# Altium integrated library WE_WR-TBL_Pluggable System_3.81 mm_rev15b.IntLib: 215 symbols (part 1 of 2)
Pins are listed as number, name and electrical type; pins without a type are passive.

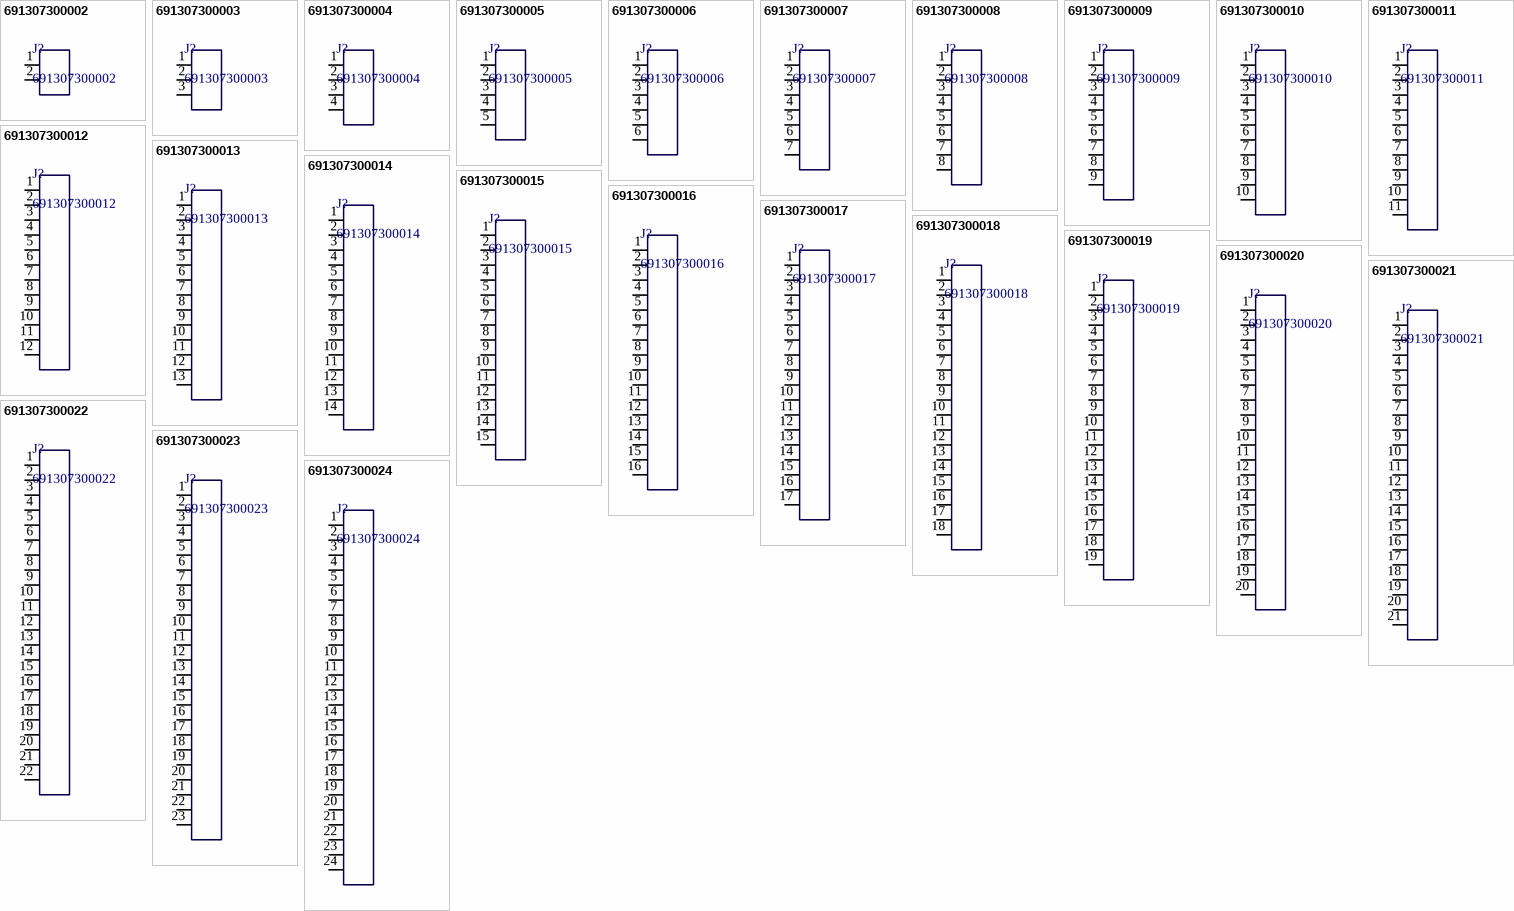
[diagram p0: symbols 691307300002 to 691307300024]

## 691307300002
designator J?
WR-TBL Terminal Blocks - Serie 3073; Manufacturer: Wurth Elektronik; ComponentLink1 Description: Manufacturer; ComponentLink2 Description: Datasheet; ComponentLink1URL: http://www.we-online.de; ComponentLink2URL: http://katalog.we-online.de/em/datasheet/6913073000xx.pdf; Created by: Baojun Chen; Created Date: 7.Sep.2015; partNo: 691307300002
footprint 691307300002 (Serie 3073 - 3.81 mm _ 2 pins)
pins: 1, 2

## 691307300003
designator J?
WR-TBL Terminal Blocks - Serie 3073; Manufacturer: Wurth Elektronik; ComponentLink1 Description: Manufacturer; ComponentLink2 Description: Datasheet; ComponentLink1URL: http://www.we-online.de; ComponentLink2URL: http://katalog.we-online.de/em/datasheet/6913073000xx.pdf; Created by: Baojun Chen; Created Date: 7.Sep.2015; partNo: 691307300003
footprint 691307300003 (Serie 3073 - 3.81 mm _ 3 pins)
pins: 1, 2, 3

## 691307300004
designator J?
WR-TBL Terminal Blocks - Serie 3073; Manufacturer: Wurth Elektronik; ComponentLink1 Description: Manufacturer; ComponentLink2 Description: Datasheet; ComponentLink1URL: http://www.we-online.de; ComponentLink2URL: http://katalog.we-online.de/em/datasheet/6913073000xx.pdf; Created by: Baojun Chen; Created Date: 7.Sep.2015; partNo: 691307300004
footprint 691307300004 (Serie 3073 - 3.81 mm _ 4 pins)
pins: 1, 2, 3, 4

## 691307300005
designator J?
WR-TBL Terminal Blocks - Serie 3073; Manufacturer: Wurth Elektronik; ComponentLink1 Description: Manufacturer; ComponentLink2 Description: Datasheet; ComponentLink1URL: http://www.we-online.de; ComponentLink2URL: http://katalog.we-online.de/em/datasheet/6913073000xx.pdf; Created by: Baojun Chen; Created Date: 7.Sep.2015; partNo: 691307300005
footprint 691307300005 (Serie 3073 - 3.81 mm _ 5 pins)
pins: 1, 2, 3, 4, 5

## 691307300006
designator J?
WR-TBL Terminal Blocks - Serie 3073; Manufacturer: Wurth Elektronik; ComponentLink1 Description: Manufacturer; ComponentLink2 Description: Datasheet; ComponentLink1URL: http://www.we-online.de; ComponentLink2URL: http://katalog.we-online.de/em/datasheet/6913073000xx.pdf; Created by: Baojun Chen; Created Date: 7.Sep.2015; partNo: 691307300006
footprint 691307300006 (Serie 3073 - 3.81 mm _ 6 pins)
pins: 1, 2, 3, 4, 5, 6

## 691307300007
designator J?
WR-TBL Terminal Blocks - Serie 3073; Manufacturer: Wurth Elektronik; ComponentLink1 Description: Manufacturer; ComponentLink2 Description: Datasheet; ComponentLink1URL: http://www.we-online.de; ComponentLink2URL: http://katalog.we-online.de/em/datasheet/6913073000xx.pdf; Created by: Baojun Chen; Created Date: 7.Sep.2015; partNo: 691307300007
footprint 691307300007 (Serie 3073 - 3.81 mm _ 7 pins)
pins: 1, 2, 3, 4, 5, 6, 7

## 691307300008
designator J?
WR-TBL Terminal Blocks - Serie 3073; Manufacturer: Wurth Elektronik; ComponentLink1 Description: Manufacturer; ComponentLink2 Description: Datasheet; ComponentLink1URL: http://www.we-online.de; ComponentLink2URL: http://katalog.we-online.de/em/datasheet/6913073000xx.pdf; Created by: Baojun Chen; Created Date: 7.Sep.2015; partNo: 691307300008
footprint 691307300008 (Serie 3073 - 3.81 mm _ 8 pins)
pins: 1, 2, 3, 4, 5, 6, 7, 8

## 691307300009
designator J?
WR-TBL Terminal Blocks - Serie 3073; Manufacturer: Wurth Elektronik; ComponentLink1 Description: Manufacturer; ComponentLink2 Description: Datasheet; ComponentLink1URL: http://www.we-online.de; ComponentLink2URL: http://katalog.we-online.de/em/datasheet/6913073000xx.pdf; Created by: Baojun Chen; Created Date: 7.Sep.2015; partNo: 691307300009
footprint 691307300009 (Serie 3073 - 3.81 mm _ 9 pins)
pins: 1, 2, 3, 4, 5, 6, 7, 8, 9

## 691307300010
designator J?
WR-TBL Terminal Blocks - Serie 3073; Manufacturer: Wurth Elektronik; ComponentLink1 Description: Manufacturer; ComponentLink2 Description: Datasheet; ComponentLink1URL: http://www.we-online.de; ComponentLink2URL: http://katalog.we-online.de/em/datasheet/6913073000xx.pdf; Created by: Baojun Chen; Created Date: 7.Sep.2015; partNo: 691307300010
footprint 691307300010 (Serie 3073 - 3.81 mm _ 10 pins)
pins: 1, 2, 3, 4, 5, 6, 7, 8, 9, 10

## 691307300011
designator J?
WR-TBL Terminal Blocks - Serie 3073; Manufacturer: Wurth Elektronik; ComponentLink1 Description: Manufacturer; ComponentLink2 Description: Datasheet; ComponentLink1URL: http://www.we-online.de; ComponentLink2URL: http://katalog.we-online.de/em/datasheet/6913073000xx.pdf; Created by: Baojun Chen; Created Date: 7.Sep.2015; partNo: 691307300011
footprint 691307300011 (Serie 3073 - 3.81 mm _ 11 pins)
pins: 1, 2, 3, 4, 5, 6, 7, 8, 9, 10, 11

## 691307300012
designator J?
WR-TBL Terminal Blocks - Serie 3073; Manufacturer: Wurth Elektronik; ComponentLink1 Description: Manufacturer; ComponentLink2 Description: Datasheet; ComponentLink1URL: http://www.we-online.de; ComponentLink2URL: http://katalog.we-online.de/em/datasheet/6913073000xx.pdf; Created by: Baojun Chen; Created Date: 7.Sep.2015; partNo: 691307300012
footprint 691307300012 (Serie 3073 - 3.81 mm _ 12 pins)
pins: 1, 2, 3, 4, 5, 6, 7, 8, 9, 10, 11, 12

## 691307300013
designator J?
WR-TBL Terminal Blocks - Serie 3073; Manufacturer: Wurth Elektronik; ComponentLink1 Description: Manufacturer; ComponentLink2 Description: Datasheet; ComponentLink1URL: http://www.we-online.de; ComponentLink2URL: http://katalog.we-online.de/em/datasheet/6913073000xx.pdf; Created by: Baojun Chen; Created Date: 7.Sep.2015; partNo: 691307300013
footprint 691307300013 (Serie 3073 - 3.81 mm _ 13 pins)
pins: 1, 2, 3, 4, 5, 6, 7, 8, 9, 10, 11, 12, 13

## 691307300014
designator J?
WR-TBL Terminal Blocks - Serie 3073; Manufacturer: Wurth Elektronik; ComponentLink1 Description: Manufacturer; ComponentLink2 Description: Datasheet; ComponentLink1URL: http://www.we-online.de; ComponentLink2URL: http://katalog.we-online.de/em/datasheet/6913073000xx.pdf; Created by: Baojun Chen; Created Date: 7.Sep.2015; partNo: 691307300014
footprint 691307300014 (Serie 3073 - 3.81 mm _ 14 pins)
pins: 1, 2, 3, 4, 5, 6, 7, 8, 9, 10, 11, 12, 13, 14

## 691307300015
designator J?
WR-TBL Terminal Blocks - Serie 3073; Manufacturer: Wurth Elektronik; ComponentLink1 Description: Manufacturer; ComponentLink2 Description: Datasheet; ComponentLink1URL: http://www.we-online.de; ComponentLink2URL: http://katalog.we-online.de/em/datasheet/6913073000xx.pdf; Created by: Baojun Chen; Created Date: 7.Sep.2015; partNo: 691307300015
footprint 691307300015 (Serie 3073 - 3.81 mm _ 15 pins)
pins: 1, 2, 3, 4, 5, 6, 7, 8, 9, 10, 11, 12, 13, 14, 15

## 691307300016
designator J?
WR-TBL Terminal Blocks - Serie 3073; Manufacturer: Wurth Elektronik; ComponentLink1 Description: Manufacturer; ComponentLink2 Description: Datasheet; ComponentLink1URL: http://www.we-online.de; ComponentLink2URL: http://katalog.we-online.de/em/datasheet/6913073000xx.pdf; Created by: Baojun Chen; Created Date: 7.Sep.2015; partNo: 691307300016
footprint 691307300016 (Serie 3073 - 3.81 mm _ 16 pins)
pins: 1, 2, 3, 4, 5, 6, 7, 8, 9, 10, 11, 12, 13, 14, 15, 16

## 691307300017
designator J?
WR-TBL Terminal Blocks - Serie 3073; Manufacturer: Wurth Elektronik; ComponentLink1 Description: Manufacturer; ComponentLink2 Description: Datasheet; ComponentLink1URL: http://www.we-online.de; ComponentLink2URL: http://katalog.we-online.de/em/datasheet/6913073000xx.pdf; Created by: Baojun Chen; Created Date: 7.Sep.2015; partNo: 691307300017
footprint 691307300017 (Serie 3073 - 3.81 mm _ 17 pins)
pins: 1, 2, 3, 4, 5, 6, 7, 8, 9, 10, 11, 12, 13, 14, 15, 16, 17

## 691307300018
designator J?
WR-TBL Terminal Blocks - Serie 3073; Manufacturer: Wurth Elektronik; ComponentLink1 Description: Manufacturer; ComponentLink2 Description: Datasheet; ComponentLink1URL: http://www.we-online.de; ComponentLink2URL: http://katalog.we-online.de/em/datasheet/6913073000xx.pdf; Created by: Baojun Chen; Created Date: 7.Sep.2015; partNo: 691307300018
footprint 691307300018 (Serie 3073 - 3.81 mm _ 18 pins)
pins: 1, 2, 3, 4, 5, 6, 7, 8, 9, 10, 11, 12, 13, 14, 15, 16, 17, 18

## 691307300019
designator J?
WR-TBL Terminal Blocks - Serie 3073; Manufacturer: Wurth Elektronik; ComponentLink1 Description: Manufacturer; ComponentLink2 Description: Datasheet; ComponentLink1URL: http://www.we-online.de; ComponentLink2URL: http://katalog.we-online.de/em/datasheet/6913073000xx.pdf; Created by: Baojun Chen; Created Date: 7.Sep.2015; partNo: 691307300019
footprint 691307300019 (Serie 3073 - 3.81 mm _ 19 pins)
pins: 1, 2, 3, 4, 5, 6, 7, 8, 9, 10, 11, 12, 13, 14, 15, 16, 17, 18, 19

## 691307300020
designator J?
WR-TBL Terminal Blocks - Serie 3073; Manufacturer: Wurth Elektronik; ComponentLink1 Description: Manufacturer; ComponentLink2 Description: Datasheet; ComponentLink1URL: http://www.we-online.de; ComponentLink2URL: http://katalog.we-online.de/em/datasheet/6913073000xx.pdf; Created by: Baojun Chen; Created Date: 7.Sep.2015; partNo: 691307300020
footprint 691307300020 (Serie 3073 - 3.81 mm _ 20 pins)
pins: 1, 2, 3, 4, 5, 6, 7, 8, 9, 10, 11, 12, 13, 14, 15, 16, 17, 18, 19, 20

## 691307300021
designator J?
WR-TBL Terminal Blocks - Serie 3073; Manufacturer: Wurth Elektronik; ComponentLink1 Description: Manufacturer; ComponentLink2 Description: Datasheet; ComponentLink1URL: http://www.we-online.de; ComponentLink2URL: http://katalog.we-online.de/em/datasheet/6913073000xx.pdf; Created by: Baojun Chen; Created Date: 7.Sep.2015; partNo: 691307300021
footprint 691307300021 (Serie 3073 - 3.81 mm _ 21 pins)
pins: 1, 2, 3, 4, 5, 6, 7, 8, 9, 10, 11, 12, 13, 14, 15, 16, 17, 18, 19, 20, 21

## 691307300022
designator J?
WR-TBL Terminal Blocks - Serie 3073; Manufacturer: Wurth Elektronik; ComponentLink1 Description: Manufacturer; ComponentLink2 Description: Datasheet; ComponentLink1URL: http://www.we-online.de; ComponentLink2URL: http://katalog.we-online.de/em/datasheet/6913073000xx.pdf; Created by: Baojun Chen; Created Date: 7.Sep.2015; partNo: 691307300022
footprint 691307300022 (Serie 3073 - 3.81 mm _ 22 pins)
pins: 1, 2, 3, 4, 5, 6, 7, 8, 9, 10, 11, 12, 13, 14, 15, 16, 17, 18, 19, 20, 21, 22

## 691307300023
designator J?
WR-TBL Terminal Blocks - Serie 3073; Manufacturer: Wurth Elektronik; ComponentLink1 Description: Manufacturer; ComponentLink2 Description: Datasheet; ComponentLink1URL: http://www.we-online.de; ComponentLink2URL: http://katalog.we-online.de/em/datasheet/6913073000xx.pdf; Created by: Baojun Chen; Created Date: 7.Sep.2015; partNo: 691307300023
footprint 691307300023 (Serie 3073 - 3.81 mm _ 23 pins)
pins: 1, 2, 3, 4, 5, 6, 7, 8, 9, 10, 11, 12, 13, 14, 15, 16, 17, 18, 19, 20, 21, 22, 23

## 691307300024
designator J?
WR-TBL Terminal Blocks - Serie 3073; Manufacturer: Wurth Elektronik; ComponentLink1 Description: Manufacturer; ComponentLink2 Description: Datasheet; ComponentLink1URL: http://www.we-online.de; ComponentLink2URL: http://katalog.we-online.de/em/datasheet/6913073000xx.pdf; Created by: Baojun Chen; Created Date: 7.Sep.2015; partNo: 691307300024
footprint 691307300024 (Serie 3073 - 3.81 mm _ 24 pins)
pins: 1, 2, 3, 4, 5, 6, 7, 8, 9, 10, 11, 12, 13, 14, 15, 16, 17, 18, 19, 20, 21, 22, 23, 24


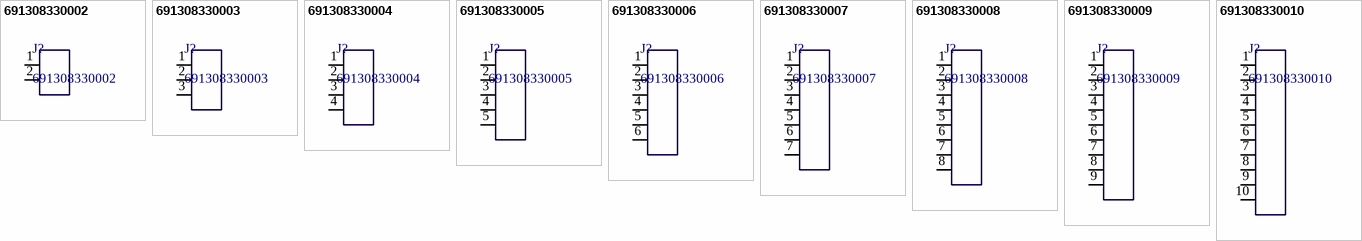
[diagram p1: symbols 691308330002 to 691308330010]

## 691308330002
designator J?
WR-TBL Terminal Blocks - Serie 3083; Manufacturer: Wurth Elektronik; ComponentLink1 Description: Manufacturer; ComponentLink2 Description: Datasheet; ComponentLink1URL: http://www.we-online.de; ComponentLink2URL: http://katalog.we-online.de/em/datasheet/6913083300xx.pdf; Created by: Baojun Chen; Created Date: 7.Sep.2015; partNo: 691308330002
footprint 691308330002 (Serie 3083 - 3.81 mm _ 2 pins)
pins: 1, 2

## 691308330003
designator J?
WR-TBL Terminal Blocks - Serie 3083; Manufacturer: Wurth Elektronik; ComponentLink1 Description: Manufacturer; ComponentLink2 Description: Datasheet; ComponentLink1URL: http://www.we-online.de; ComponentLink2URL: http://katalog.we-online.de/em/datasheet/6913083300xx.pdf; Created by: Baojun Chen; Created Date: 7.Sep.2015; partNo: 691308330003
footprint 691308330003 (Serie 3083 - 3.81 mm _ 3 pins)
pins: 1, 2, 3

## 691308330004
designator J?
WR-TBL Terminal Blocks - Serie 3083; Manufacturer: Wurth Elektronik; ComponentLink1 Description: Manufacturer; ComponentLink2 Description: Datasheet; ComponentLink1URL: http://www.we-online.de; ComponentLink2URL: http://katalog.we-online.de/em/datasheet/6913083300xx.pdf; Created by: Baojun Chen; Created Date: 7.Sep.2015; partNo: 691308330004
footprint 691308330004 (Serie 3083 - 3.81 mm _ 4 pins)
pins: 1, 2, 3, 4

## 691308330005
designator J?
WR-TBL Terminal Blocks - Serie 3083; Manufacturer: Wurth Elektronik; ComponentLink1 Description: Manufacturer; ComponentLink2 Description: Datasheet; ComponentLink1URL: http://www.we-online.de; ComponentLink2URL: http://katalog.we-online.de/em/datasheet/6913083300xx.pdf; Created by: Baojun Chen; Created Date: 7.Sep.2015; partNo: 691308330005
footprint 691308330005 (Serie 3083 - 3.81 mm _ 5 pins)
pins: 1, 2, 3, 4, 5

## 691308330006
designator J?
WR-TBL Terminal Blocks - Serie 3083; Manufacturer: Wurth Elektronik; ComponentLink1 Description: Manufacturer; ComponentLink2 Description: Datasheet; ComponentLink1URL: http://www.we-online.de; ComponentLink2URL: http://katalog.we-online.de/em/datasheet/6913083300xx.pdf; Created by: Baojun Chen; Created Date: 7.Sep.2015; partNo: 691308330006
footprint 691308330006 (Serie 3083 - 3.81 mm _ 6 pins)
pins: 1, 2, 3, 4, 5, 6

## 691308330007
designator J?
WR-TBL Terminal Blocks - Serie 3083; Manufacturer: Wurth Elektronik; ComponentLink1 Description: Manufacturer; ComponentLink2 Description: Datasheet; ComponentLink1URL: http://www.we-online.de; ComponentLink2URL: http://katalog.we-online.de/em/datasheet/6913083300xx.pdf; Created by: Baojun Chen; Created Date: 7.Sep.2015; partNo: 691308330007
footprint 691308330007 (Serie 3083 - 3.81 mm _ 7 pins)
pins: 1, 2, 3, 4, 5, 6, 7

## 691308330008
designator J?
WR-TBL Terminal Blocks - Serie 3083; Manufacturer: Wurth Elektronik; ComponentLink1 Description: Manufacturer; ComponentLink2 Description: Datasheet; ComponentLink1URL: http://www.we-online.de; ComponentLink2URL: http://katalog.we-online.de/em/datasheet/6913083300xx.pdf; Created by: Baojun Chen; Created Date: 7.Sep.2015; partNo: 691308330008
footprint 691308330008 (Serie 3083 - 3.81 mm _ 8 pins)
pins: 1, 2, 3, 4, 5, 6, 7, 8

## 691308330009
designator J?
WR-TBL Terminal Blocks - Serie 3083; Manufacturer: Wurth Elektronik; ComponentLink1 Description: Manufacturer; ComponentLink2 Description: Datasheet; ComponentLink1URL: http://www.we-online.de; ComponentLink2URL: http://katalog.we-online.de/em/datasheet/6913083300xx.pdf; Created by: Baojun Chen; Created Date: 7.Sep.2015; partNo: 691308330009
footprint 691308330009 (Serie 3083 - 3.81 mm _ 9 pins)
pins: 1, 2, 3, 4, 5, 6, 7, 8, 9

## 691308330010
designator J?
WR-TBL Terminal Blocks - Serie 3083; Manufacturer: Wurth Elektronik; ComponentLink1 Description: Manufacturer; ComponentLink2 Description: Datasheet; ComponentLink1URL: http://www.we-online.de; ComponentLink2URL: http://katalog.we-online.de/em/datasheet/6913083300xx.pdf; Created by: Baojun Chen; Created Date: 7.Sep.2015; partNo: 691308330010
footprint 691308330010 (Serie 3083 - 3.81 mm _ 10 pins)
pins: 1, 2, 3, 4, 5, 6, 7, 8, 9, 10


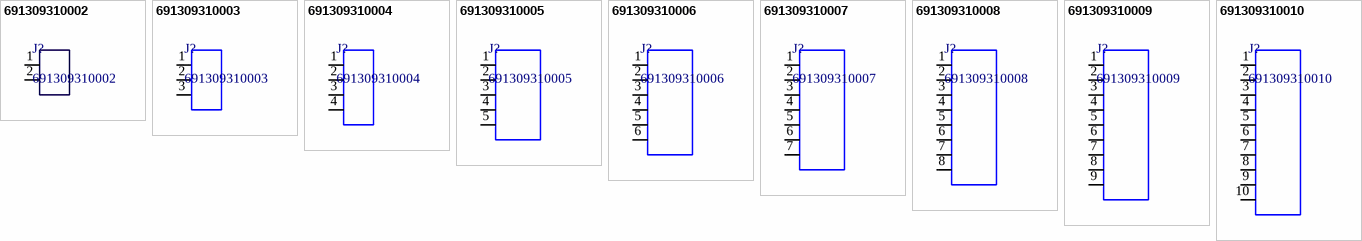
[diagram p2: symbols 691309310002 to 691309310010]

## 691309310002
designator J?
WR-TBL Terminal Blocks - Serie 3093; Manufacturer: Wurth Elektronik; ComponentLink1 Description: Manufacturer; ComponentLink2 Description: Datasheet; ComponentLink1URL: http://www.we-online.de; ComponentLink2URL: http://katalog.we-online.de/em/datasheet/6913093100xx.pdf; Created by: Baojun Chen; Created Date: 8.Sep.2015; partNo: 691309310002
footprint 691309310002 (Serie 3093 - 3.81 mm _ 2 pins)
pins: 1, 2

## 691309310003
designator J?
WR-TBL Terminal Blocks - Serie 3093; Manufacturer: Wurth Elektronik; ComponentLink1 Description: Manufacturer; ComponentLink2 Description: Datasheet; ComponentLink1URL: http://www.we-online.de; ComponentLink2URL: http://katalog.we-online.de/em/datasheet/6913093100xx.pdf; Created by: Baojun Chen; Created Date: 8.Sep.2015; partNo: 691309310003
footprint 691309310003 (Serie 3093 - 3.81 mm _ 3 pins)
pins: 1, 2, 3

## 691309310004
designator J?
WR-TBL Terminal Blocks - Serie 3093; Manufacturer: Wurth Elektronik; ComponentLink1 Description: Manufacturer; ComponentLink2 Description: Datasheet; ComponentLink1URL: http://www.we-online.de; ComponentLink2URL: http://katalog.we-online.de/em/datasheet/6913093100xx.pdf; Created by: Baojun Chen; Created Date: 8.Sep.2015; partNo: 691309310004
footprint 691309310004 (Serie 3093 - 3.81 mm _ 4 pins)
pins: 1, 2, 3, 4

## 691309310005
designator J?
WR-TBL Terminal Blocks - Serie 3093; Manufacturer: Wurth Elektronik; ComponentLink1 Description: Manufacturer; ComponentLink2 Description: Datasheet; ComponentLink1URL: http://www.we-online.de; ComponentLink2URL: http://katalog.we-online.de/em/datasheet/6913093100xx.pdf; Created by: Baojun Chen; Created Date: 8.Sep.2015; partNo: 691309310005
footprint 691309310005 (Serie 3093 - 3.81 mm _ 5 pins)
pins: 1, 2, 3, 4, 5

## 691309310006
designator J?
WR-TBL Terminal Blocks - Serie 3093; Manufacturer: Wurth Elektronik; ComponentLink1 Description: Manufacturer; ComponentLink2 Description: Datasheet; ComponentLink1URL: http://www.we-online.de; ComponentLink2URL: http://katalog.we-online.de/em/datasheet/6913093100xx.pdf; Created by: Baojun Chen; Created Date: 8.Sep.2015; partNo: 691309310006
footprint 691309310006 (Serie 3093 - 3.81 mm _ 6 pins)
pins: 1, 2, 3, 4, 5, 6

## 691309310007
designator J?
WR-TBL Terminal Blocks - Serie 3093; Manufacturer: Wurth Elektronik; ComponentLink1 Description: Manufacturer; ComponentLink2 Description: Datasheet; ComponentLink1URL: http://www.we-online.de; ComponentLink2URL: http://katalog.we-online.de/em/datasheet/6913093100xx.pdf; Created by: Baojun Chen; Created Date: 8.Sep.2015; partNo: 691309310007
footprint 691309310007 (Serie 3093 - 3.81 mm _ 7 pins)
pins: 1, 2, 3, 4, 5, 6, 7

## 691309310008
designator J?
WR-TBL Terminal Blocks - Serie 3093; Manufacturer: Wurth Elektronik; ComponentLink1 Description: Manufacturer; ComponentLink2 Description: Datasheet; ComponentLink1URL: http://www.we-online.de; ComponentLink2URL: http://katalog.we-online.de/em/datasheet/6913093100xx.pdf; Created by: Baojun Chen; Created Date: 8.Sep.2015; partNo: 691309310008
footprint 691309310008 (Serie 3093 - 3.81 mm _ 8 pins)
pins: 1, 2, 3, 4, 5, 6, 7, 8

## 691309310009
designator J?
WR-TBL Terminal Blocks - Serie 3093; Manufacturer: Wurth Elektronik; ComponentLink1 Description: Manufacturer; ComponentLink2 Description: Datasheet; ComponentLink1URL: http://www.we-online.de; ComponentLink2URL: http://katalog.we-online.de/em/datasheet/6913093100xx.pdf; Created by: Baojun Chen; Created Date: 8.Sep.2015; partNo: 691309310009
footprint 691309310009 (Serie 3093 - 3.81 mm _ 9 pins)
pins: 1, 2, 3, 4, 5, 6, 7, 8, 9

## 691309310010
designator J?
WR-TBL Terminal Blocks - Serie 3093; Manufacturer: Wurth Elektronik; ComponentLink1 Description: Manufacturer; ComponentLink2 Description: Datasheet; ComponentLink1URL: http://www.we-online.de; ComponentLink2URL: http://katalog.we-online.de/em/datasheet/6913093100xx.pdf; Created by: Baojun Chen; Created Date: 8.Sep.2015; partNo: 691309310010
footprint 691309310010 (Serie 3093 - 3.81 mm _ 10 pins)
pins: 1, 2, 3, 4, 5, 6, 7, 8, 9, 10


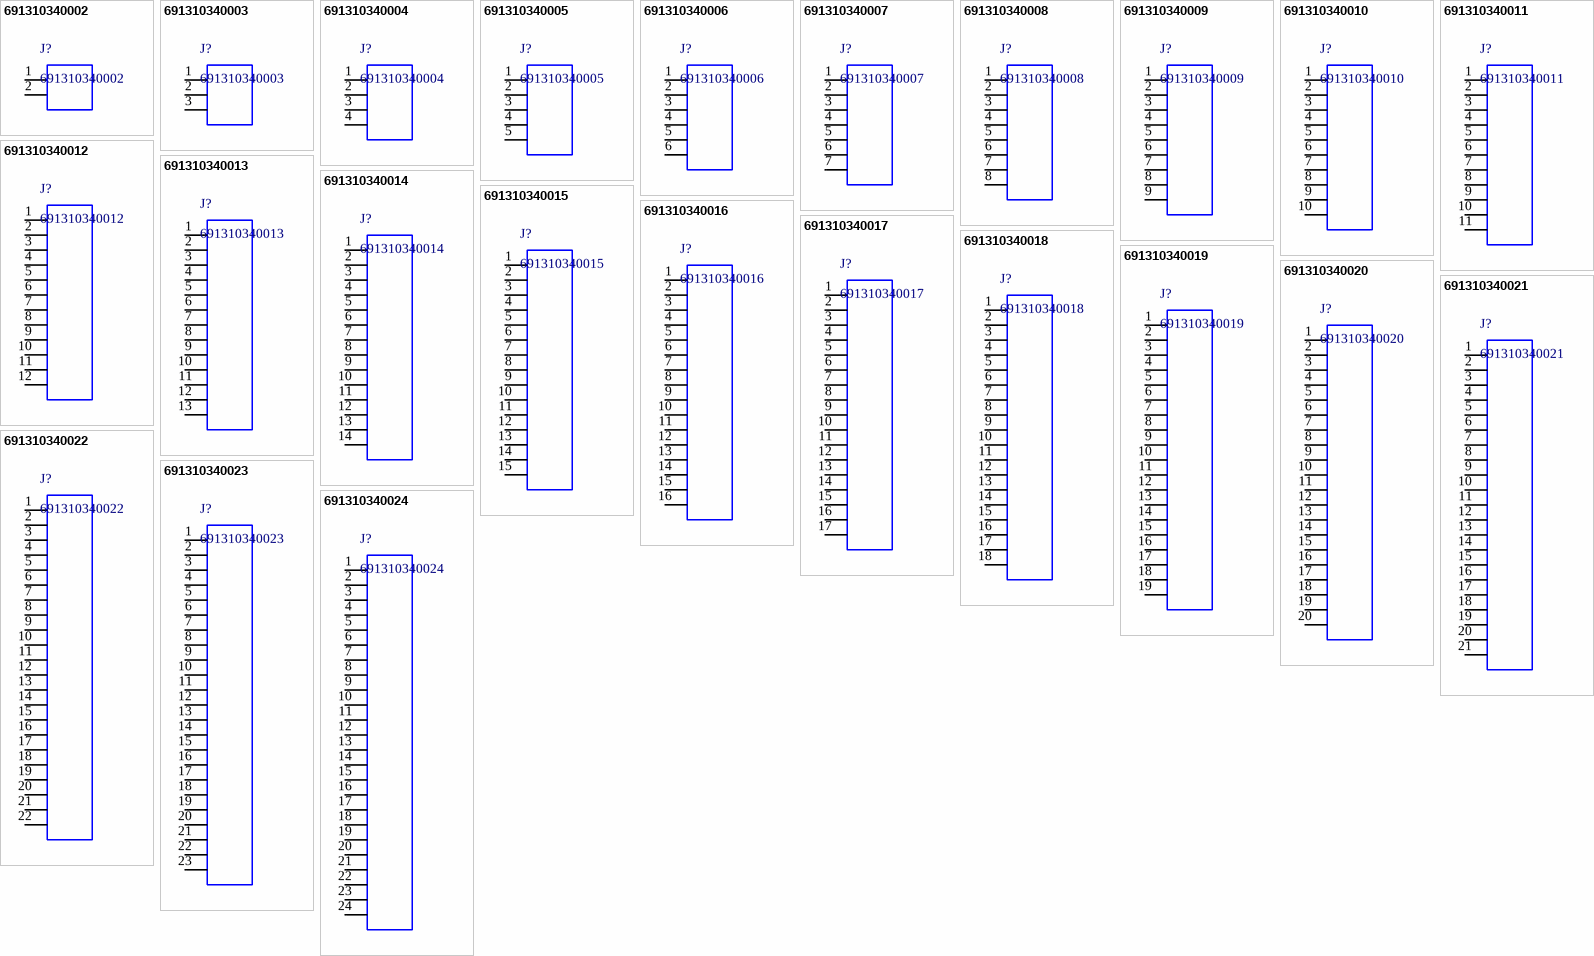
[diagram p3: symbols 691310340002 to 691310340024]

## 691310340002
designator J?
WR-TBL Terminal Blocks - Serie 3103; Manufacturer: Wurth Elektronik; ComponentLink1 Description: Manufacturer; ComponentLink2 Description: Datasheet; ComponentLink1URL: http://www.we-online.de; ComponentLink2URL: http://katalog.we-online.de/em/datasheet/6913103400xx.pdf; Created by: Baojun Chen; Created Date: 8.Sep.2015; partNo: 691310340002
footprint 691310340002 (Serie 3103 - 3.81 mm _ 2 pins)
pins: 1, 2

## 691310340003
designator J?
WR-TBL Terminal Blocks - Serie 3103; Manufacturer: Wurth Elektronik; ComponentLink1 Description: Manufacturer; ComponentLink2 Description: Datasheet; ComponentLink1URL: http://www.we-online.de; ComponentLink2URL: http://katalog.we-online.de/em/datasheet/6913103400xx.pdf; Created by: Baojun Chen; Created Date: 8.Sep.2015; partNo: 691310340003
footprint 691310340003 (Serie 3103 - 3.81 mm _ 3 pins)
pins: 1, 2, 3

## 691310340004
designator J?
WR-TBL Terminal Blocks - Serie 3103; Manufacturer: Wurth Elektronik; ComponentLink1 Description: Manufacturer; ComponentLink2 Description: Datasheet; ComponentLink1URL: http://www.we-online.de; ComponentLink2URL: http://katalog.we-online.de/em/datasheet/6913103400xx.pdf; Created by: Baojun Chen; Created Date: 8.Sep.2015; partNo: 691310340004
footprint 691310340004 (Serie 3103 - 3.81 mm _ 4 pins)
pins: 1, 2, 3, 4

## 691310340005
designator J?
WR-TBL Terminal Blocks - Serie 3103; Manufacturer: Wurth Elektronik; ComponentLink1 Description: Manufacturer; ComponentLink2 Description: Datasheet; ComponentLink1URL: http://www.we-online.de; ComponentLink2URL: http://katalog.we-online.de/em/datasheet/6913103400xx.pdf; Created by: Baojun Chen; Created Date: 8.Sep.2015; partNo: 691310340005
footprint 691310340005 (Serie 3103 - 3.81 mm _ 5 pins)
pins: 1, 2, 3, 4, 5

## 691310340006
designator J?
WR-TBL Terminal Blocks - Serie 3103; Manufacturer: Wurth Elektronik; ComponentLink1 Description: Manufacturer; ComponentLink2 Description: Datasheet; ComponentLink1URL: http://www.we-online.de; ComponentLink2URL: http://katalog.we-online.de/em/datasheet/6913103400xx.pdf; Created by: Baojun Chen; Created Date: 8.Sep.2015; partNo: 691310340006
footprint 691310340006 (Serie 3103 - 3.81 mm _ 6 pins)
pins: 1, 2, 3, 4, 5, 6

## 691310340007
designator J?
WR-TBL Terminal Blocks - Serie 3103; Manufacturer: Wurth Elektronik; ComponentLink1 Description: Manufacturer; ComponentLink2 Description: Datasheet; ComponentLink1URL: http://www.we-online.de; ComponentLink2URL: http://katalog.we-online.de/em/datasheet/6913103400xx.pdf; Created by: Baojun Chen; Created Date: 8.Sep.2015; partNo: 691310340007
footprint 691310340007 (Serie 3103 - 3.81 mm _ 7 pins)
pins: 1, 2, 3, 4, 5, 6, 7

## 691310340008
designator J?
WR-TBL Terminal Blocks - Serie 3103; Manufacturer: Wurth Elektronik; ComponentLink1 Description: Manufacturer; ComponentLink2 Description: Datasheet; ComponentLink1URL: http://www.we-online.de; ComponentLink2URL: http://katalog.we-online.de/em/datasheet/6913103400xx.pdf; Created by: Baojun Chen; Created Date: 8.Sep.2015; partNo: 691310340008
footprint 691310340008 (Serie 3103 - 3.81 mm _ 8 pins)
pins: 1, 2, 3, 4, 5, 6, 7, 8

## 691310340009
designator J?
WR-TBL Terminal Blocks - Serie 3103; Manufacturer: Wurth Elektronik; ComponentLink1 Description: Manufacturer; ComponentLink2 Description: Datasheet; ComponentLink1URL: http://www.we-online.de; ComponentLink2URL: http://katalog.we-online.de/em/datasheet/6913103400xx.pdf; Created by: Baojun Chen; Created Date: 8.Sep.2015; partNo: 691310340009
footprint 691310340009 (Serie 3103 - 3.81 mm _ 9 pins)
pins: 1, 2, 3, 4, 5, 6, 7, 8, 9

## 691310340010
designator J?
WR-TBL Terminal Blocks - Serie 3103; Manufacturer: Wurth Elektronik; ComponentLink1 Description: Manufacturer; ComponentLink2 Description: Datasheet; ComponentLink1URL: http://www.we-online.de; ComponentLink2URL: http://katalog.we-online.de/em/datasheet/6913103400xx.pdf; Created by: Baojun Chen; Created Date: 8.Sep.2015; partNo: 691310340010
footprint 691310340010 (Serie 3103 - 3.81 mm _ 10 pins)
pins: 1, 2, 3, 4, 5, 6, 7, 8, 9, 10

## 691310340011
designator J?
WR-TBL Terminal Blocks - Serie 3103; Manufacturer: Wurth Elektronik; ComponentLink1 Description: Manufacturer; ComponentLink2 Description: Datasheet; ComponentLink1URL: http://www.we-online.de; ComponentLink2URL: http://katalog.we-online.de/em/datasheet/6913103400xx.pdf; Created by: Baojun Chen; Created Date: 8.Sep.2015; partNo: 691310340011
footprint 691310340011 (Serie 3103 - 3.81 mm _ 11 pins)
pins: 1, 2, 3, 4, 5, 6, 7, 8, 9, 10, 11

## 691310340012
designator J?
WR-TBL Terminal Blocks - Serie 3103; Manufacturer: Wurth Elektronik; ComponentLink1 Description: Manufacturer; ComponentLink2 Description: Datasheet; ComponentLink1URL: http://www.we-online.de; ComponentLink2URL: http://katalog.we-online.de/em/datasheet/6913103400xx.pdf; Created by: Baojun Chen; Created Date: 8.Sep.2015; partNo: 691310340012
footprint 691310340012 (Serie 3103 - 3.81 mm _ 12 pins)
pins: 1, 2, 3, 4, 5, 6, 7, 8, 9, 10, 11, 12

## 691310340013
designator J?
WR-TBL Terminal Blocks - Serie 3103; Manufacturer: Wurth Elektronik; ComponentLink1 Description: Manufacturer; ComponentLink2 Description: Datasheet; ComponentLink1URL: http://www.we-online.de; ComponentLink2URL: http://katalog.we-online.de/em/datasheet/6913103400xx.pdf; Created by: Baojun Chen; Created Date: 8.Sep.2015; partNo: 691310340013
footprint 691310340013 (Serie 3103 - 3.81 mm _ 13 pins)
pins: 1, 2, 3, 4, 5, 6, 7, 8, 9, 10, 11, 12, 13

## 691310340014
designator J?
WR-TBL Terminal Blocks - Serie 3103; Manufacturer: Wurth Elektronik; ComponentLink1 Description: Manufacturer; ComponentLink2 Description: Datasheet; ComponentLink1URL: http://www.we-online.de; ComponentLink2URL: http://katalog.we-online.de/em/datasheet/6913103400xx.pdf; Created by: Baojun Chen; Created Date: 8.Sep.2015; partNo: 691310340014
footprint 691310340014 (Serie 3103 - 3.81 mm _ 14 pins)
pins: 1, 2, 3, 4, 5, 6, 7, 8, 9, 10, 11, 12, 13, 14

## 691310340015
designator J?
WR-TBL Terminal Blocks - Serie 3103; Manufacturer: Wurth Elektronik; ComponentLink1 Description: Manufacturer; ComponentLink2 Description: Datasheet; ComponentLink1URL: http://www.we-online.de; ComponentLink2URL: http://katalog.we-online.de/em/datasheet/6913103400xx.pdf; Created by: Baojun Chen; Created Date: 8.Sep.2015; partNo: 691310340015
footprint 691310340015 (Serie 3103 - 3.81 mm _ 15 pins)
pins: 1, 2, 3, 4, 5, 6, 7, 8, 9, 10, 11, 12, 13, 14, 15

## 691310340016
designator J?
WR-TBL Terminal Blocks - Serie 3103; Manufacturer: Wurth Elektronik; ComponentLink1 Description: Manufacturer; ComponentLink2 Description: Datasheet; ComponentLink1URL: http://www.we-online.de; ComponentLink2URL: http://katalog.we-online.de/em/datasheet/6913103400xx.pdf; Created by: Baojun Chen; Created Date: 8.Sep.2015; partNo: 691310340016
footprint 691310340016 (Serie 3103 - 3.81 mm _ 16 pins)
pins: 1, 2, 3, 4, 5, 6, 7, 8, 9, 10, 11, 12, 13, 14, 15, 16

## 691310340017
designator J?
WR-TBL Terminal Blocks - Serie 3103; Manufacturer: Wurth Elektronik; ComponentLink1 Description: Manufacturer; ComponentLink2 Description: Datasheet; ComponentLink1URL: http://www.we-online.de; ComponentLink2URL: http://katalog.we-online.de/em/datasheet/6913103400xx.pdf; Created by: Baojun Chen; Created Date: 8.Sep.2015; partNo: 691310340017
footprint 691310340017 (Serie 3103 - 3.81 mm _ 17 pins)
pins: 1, 2, 3, 4, 5, 6, 7, 8, 9, 10, 11, 12, 13, 14, 15, 16, 17

## 691310340018
designator J?
WR-TBL Terminal Blocks - Serie 3103; Manufacturer: Wurth Elektronik; ComponentLink1 Description: Manufacturer; ComponentLink2 Description: Datasheet; ComponentLink1URL: http://www.we-online.de; ComponentLink2URL: http://katalog.we-online.de/em/datasheet/6913103400xx.pdf; Created by: Baojun Chen; Created Date: 8.Sep.2015; partNo: 691310340018
footprint 691310340018 (Serie 3103 - 3.81 mm _ 18 pins)
pins: 1, 2, 3, 4, 5, 6, 7, 8, 9, 10, 11, 12, 13, 14, 15, 16, 17, 18

## 691310340019
designator J?
WR-TBL Terminal Blocks - Serie 3103; Manufacturer: Wurth Elektronik; ComponentLink1 Description: Manufacturer; ComponentLink2 Description: Datasheet; ComponentLink1URL: http://www.we-online.de; ComponentLink2URL: http://katalog.we-online.de/em/datasheet/6913103400xx.pdf; Created by: Baojun Chen; Created Date: 8.Sep.2015; partNo: 691310340019
footprint 691310340019 (Serie 3103 - 3.81 mm _ 19 pins)
pins: 1, 2, 3, 4, 5, 6, 7, 8, 9, 10, 11, 12, 13, 14, 15, 16, 17, 18, 19

## 691310340020
designator J?
WR-TBL Terminal Blocks - Serie 3103; Manufacturer: Wurth Elektronik; ComponentLink1 Description: Manufacturer; ComponentLink2 Description: Datasheet; ComponentLink1URL: http://www.we-online.de; ComponentLink2URL: http://katalog.we-online.de/em/datasheet/6913103400xx.pdf; Created by: Baojun Chen; Created Date: 8.Sep.2015; partNo: 691310340020
footprint 691310340020 (Serie 3103 - 3.81 mm _ 20 pins)
pins: 1, 2, 3, 4, 5, 6, 7, 8, 9, 10, 11, 12, 13, 14, 15, 16, 17, 18, 19, 20

## 691310340021
designator J?
WR-TBL Terminal Blocks - Serie 3103; Manufacturer: Wurth Elektronik; ComponentLink1 Description: Manufacturer; ComponentLink2 Description: Datasheet; ComponentLink1URL: http://www.we-online.de; ComponentLink2URL: http://katalog.we-online.de/em/datasheet/6913103400xx.pdf; Created by: Baojun Chen; Created Date: 8.Sep.2015; partNo: 691310340021
footprint 691310340021 (Serie 3103 - 3.81 mm _ 21 pins)
pins: 1, 2, 3, 4, 5, 6, 7, 8, 9, 10, 11, 12, 13, 14, 15, 16, 17, 18, 19, 20, 21

## 691310340022
designator J?
WR-TBL Terminal Blocks - Serie 3103; Manufacturer: Wurth Elektronik; ComponentLink1 Description: Manufacturer; ComponentLink2 Description: Datasheet; ComponentLink1URL: http://www.we-online.de; ComponentLink2URL: http://katalog.we-online.de/em/datasheet/6913103400xx.pdf; Created by: Baojun Chen; Created Date: 8.Sep.2015; partNo: 691310340022
footprint 691310340022 (Serie 3103 - 3.81 mm _ 22 pins)
pins: 1, 2, 3, 4, 5, 6, 7, 8, 9, 10, 11, 12, 13, 14, 15, 16, 17, 18, 19, 20, 21, 22

## 691310340023
designator J?
WR-TBL Terminal Blocks - Serie 3103; Manufacturer: Wurth Elektronik; ComponentLink1 Description: Manufacturer; ComponentLink2 Description: Datasheet; ComponentLink1URL: http://www.we-online.de; ComponentLink2URL: http://katalog.we-online.de/em/datasheet/6913103400xx.pdf; Created by: Baojun Chen; Created Date: 8.Sep.2015; partNo: 691310340023
footprint 691310340023 (Serie 3103 - 3.81 mm _ 23 pins)
pins: 1, 2, 3, 4, 5, 6, 7, 8, 9, 10, 11, 12, 13, 14, 15, 16, 17, 18, 19, 20, 21, 22, 23

## 691310340024
designator J?
WR-TBL Terminal Blocks - Serie 3103; Manufacturer: Wurth Elektronik; ComponentLink1 Description: Manufacturer; ComponentLink2 Description: Datasheet; ComponentLink1URL: http://www.we-online.de; ComponentLink2URL: http://katalog.we-online.de/em/datasheet/6913103400xx.pdf; Created by: Baojun Chen; Created Date: 8.Sep.2015; partNo: 691310340024
footprint 691307300024 (Serie 3073 - 3.81 mm _ 24 pins)
pins: 1, 2, 3, 4, 5, 6, 7, 8, 9, 10, 11, 12, 13, 14, 15, 16, 17, 18, 19, 20, 21, 22, 23, 24


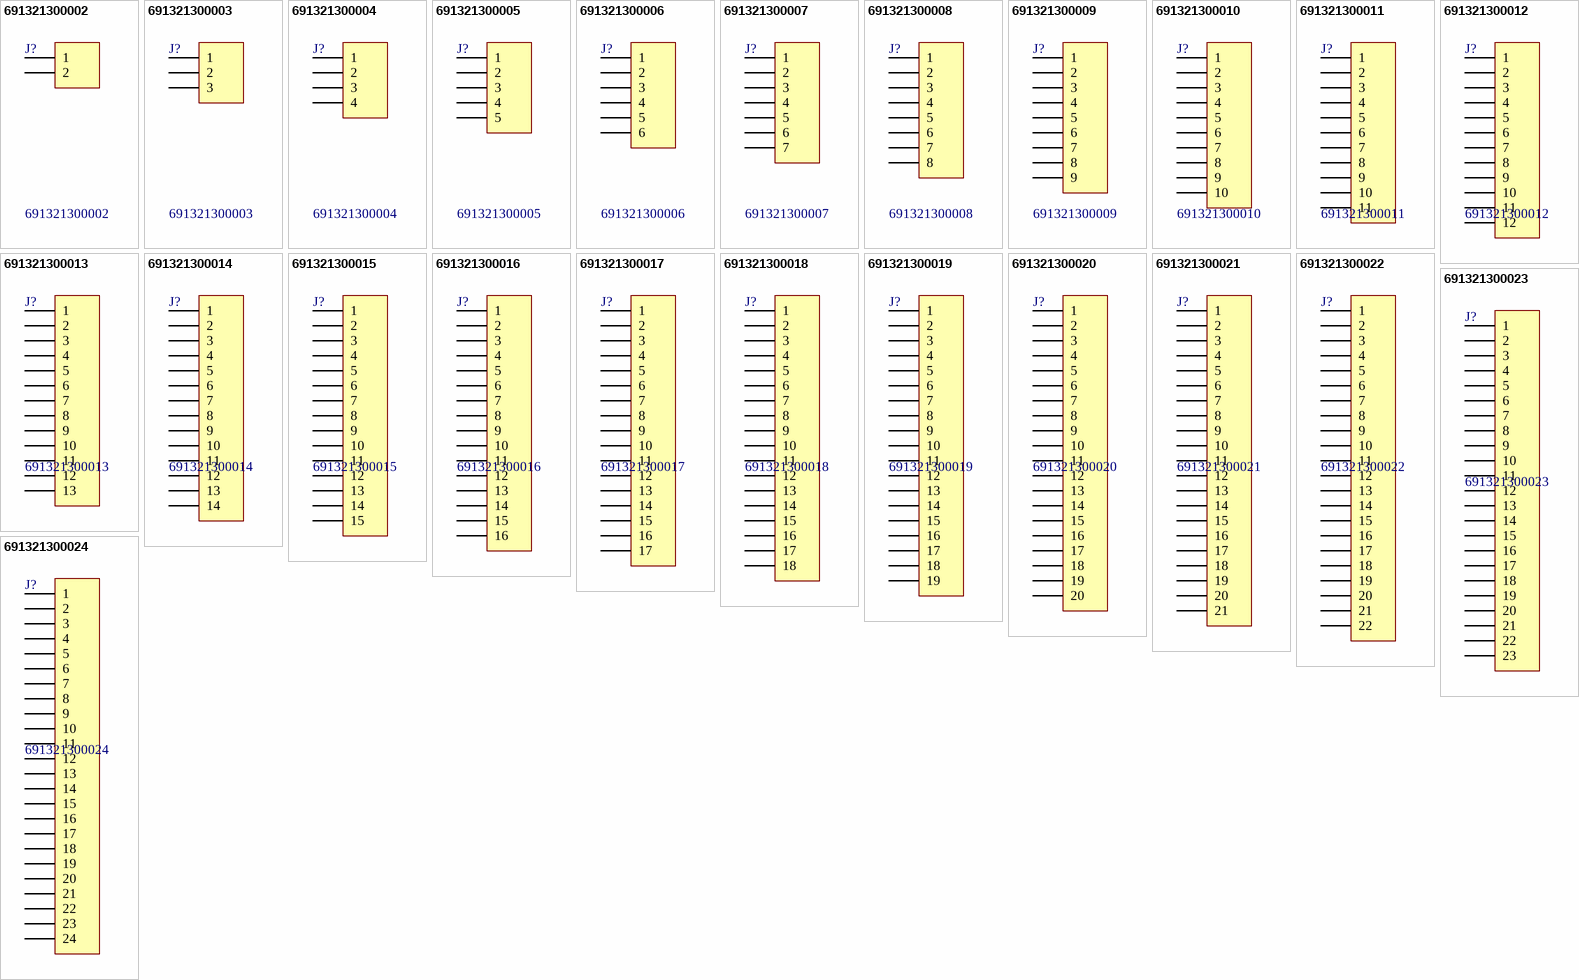
[diagram p4: symbols 691321300002 to 691321300024]

## 691321300002
designator J?
WR-TBL Terminal block - serie 3213- 3.81 mm; Manufacturer: Würth Elektronik eiSos GmbH; ComponentLink1 Description: Manufacturer; ComponentLink2 Description: Datasheet; NoPins: 2; Created Date: 11 December 2013; partNo: 691321300002; ComponentLink1URL: http://www.we-online.com; ComponentLink2URL: http://katalog.we-online.de/em/datasheet/6913213000xx.pdf; Created by: Karrer Zheng
footprint 691321300002 (3,81mm - PCB Headers - Vertical - 02p)
pins: 1, 2

## 691321300003
designator J?
WR-TBL Terminal block - serie 3213- 3.81 mm; Manufacturer: Würth Elektronik eiSos GmbH; ComponentLink1 Description: Manufacturer; ComponentLink2 Description: Datasheet; NoPins: 3; Created Date: 11 December 2013; partNo: 691321300003; ComponentLink1URL: http://www.we-online.com; ComponentLink2URL: http://katalog.we-online.de/em/datasheet/6913213000xx.pdf; Created by: Karrer Zheng
footprint 691321300003 (3,81mm - PCB Headers - Vertical - 03p)
pins: 1, 2, 3

## 691321300004
designator J?
WR-TBL Terminal block - serie 3213- 3.81 mm; Manufacturer: Würth Elektronik eiSos GmbH; ComponentLink1 Description: Manufacturer; ComponentLink2 Description: Datasheet; NoPins: 4; Created Date: 11 December 2013; partNo: 691321300004; ComponentLink1URL: http://www.we-online.com; ComponentLink2URL: http://katalog.we-online.de/em/datasheet/6913213000xx.pdf; Created by: Karrer Zheng
footprint 691321300004 (3,81mm - PCB Headers - Vertical - 04p)
pins: 1, 2, 3, 4

## 691321300005
designator J?
WR-TBL Terminal block - serie 3213- 3.81 mm; Manufacturer: Würth Elektronik eiSos GmbH; ComponentLink1 Description: Manufacturer; ComponentLink2 Description: Datasheet; NoPins: 5; Created Date: 11 December 2013; partNo: 691321300005; ComponentLink1URL: http://www.we-online.com; ComponentLink2URL: http://katalog.we-online.de/em/datasheet/6913213000xx.pdf; Created by: Karrer Zheng
footprint 691321300005 (3,81mm - PCB Headers - Vertical - 05p)
pins: 1, 2, 3, 4, 5

## 691321300006
designator J?
WR-TBL Terminal block - serie 3213- 3.81 mm; Manufacturer: Würth Elektronik eiSos GmbH; ComponentLink1 Description: Manufacturer; ComponentLink2 Description: Datasheet; NoPins: 6; Created Date: 11 December 2013; partNo: 691321300006; ComponentLink1URL: http://www.we-online.com; ComponentLink2URL: http://katalog.we-online.de/em/datasheet/6913213000xx.pdf; Created by: Karrer Zheng
footprint 691321300006 (3,81mm - PCB Headers - Vertical - 06p)
pins: 1, 2, 3, 4, 5, 6

## 691321300007
designator J?
WR-TBL Terminal block - serie 3213- 3.81 mm; Manufacturer: Würth Elektronik eiSos GmbH; ComponentLink1 Description: Manufacturer; ComponentLink2 Description: Datasheet; NoPins: 7; Created Date: 11 December 2013; partNo: 691321300007; ComponentLink1URL: http://www.we-online.com; ComponentLink2URL: http://katalog.we-online.de/em/datasheet/6913213000xx.pdf; Created by: Karrer Zheng
footprint 691321300007 (3,81mm - PCB Headers - Vertical - 07p)
pins: 1, 2, 3, 4, 5, 6, 7

## 691321300008
designator J?
WR-TBL Terminal block - serie 3213- 3.81 mm; Manufacturer: Würth Elektronik eiSos GmbH; ComponentLink1 Description: Manufacturer; ComponentLink2 Description: Datasheet; NoPins: 8; Created Date: 11 December 2013; partNo: 691321300008; ComponentLink1URL: http://www.we-online.com; ComponentLink2URL: http://katalog.we-online.de/em/datasheet/6913213000xx.pdf; Created by: Karrer Zheng
footprint 691321300008 (3,81mm - PCB Headers - Vertical - 08p)
pins: 1, 2, 3, 4, 5, 6, 7, 8

## 691321300009
designator J?
WR-TBL Terminal block - serie 3213- 3.81 mm; Manufacturer: Würth Elektronik eiSos GmbH; ComponentLink1 Description: Manufacturer; ComponentLink2 Description: Datasheet; NoPins: 9; Created Date: 11 December 2013; partNo: 691321300009; ComponentLink1URL: http://www.we-online.com; ComponentLink2URL: http://katalog.we-online.de/em/datasheet/6913213000xx.pdf; Created by: Karrer Zheng
footprint 691321300009 (3,81mm - PCB Headers - Vertical - 09p)
pins: 1, 2, 3, 4, 5, 6, 7, 8, 9

## 691321300010
designator J?
WR-TBL Terminal block - serie 3213- 3.81 mm; Manufacturer: Würth Elektronik eiSos GmbH; ComponentLink1 Description: Manufacturer; ComponentLink2 Description: Datasheet; NoPins: 10; Created Date: 11 December 2013; partNo: 691321300010; ComponentLink1URL: http://www.we-online.com; ComponentLink2URL: http://katalog.we-online.de/em/datasheet/6913213000xx.pdf; Created by: Karrer Zheng
footprint 691321300010 (3,81mm - PCB Headers - Vertical - 10p)
pins: 1, 2, 3, 4, 5, 6, 7, 8, 9, 10

## 691321300011
designator J?
WR-TBL Terminal block - serie 3213- 3.81 mm; Manufacturer: Würth Elektronik eiSos GmbH; ComponentLink1 Description: Manufacturer; ComponentLink2 Description: Datasheet; NoPins: 11; Created Date: 11 December 2013; partNo: 691321300011; ComponentLink1URL: http://www.we-online.com; ComponentLink2URL: http://katalog.we-online.de/em/datasheet/6913213000xx.pdf; Created by: Karrer Zheng
footprint 691321300011 (3,81mm - PCB Headers - Vertical - 11p)
pins: 1, 2, 3, 4, 5, 6, 7, 8, 9, 10, 11

## 691321300012
designator J?
WR-TBL Terminal block - serie 3213- 3.81 mm; Manufacturer: Würth Elektronik eiSos GmbH; ComponentLink1 Description: Manufacturer; ComponentLink2 Description: Datasheet; NoPins: 12; Created Date: 11 December 2013; partNo: 691321300012; ComponentLink1URL: http://www.we-online.com; ComponentLink2URL: http://katalog.we-online.de/em/datasheet/6913213000xx.pdf; Created by: Karrer Zheng
footprint 691321300012 (3,81mm - PCB Headers - Vertical - 12p)
pins: 1, 2, 3, 4, 5, 6, 7, 8, 9, 10, 11, 12

## 691321300013
designator J?
WR-TBL Terminal block - serie 3213- 3.81 mm; Manufacturer: Würth Elektronik eiSos GmbH; ComponentLink1 Description: Manufacturer; ComponentLink2 Description: Datasheet; NoPins: 13; Created Date: 11 December 2013; partNo: 691321300013; ComponentLink1URL: http://www.we-online.com; ComponentLink2URL: http://katalog.we-online.de/em/datasheet/6913213000xx.pdf; Created by: Karrer Zheng
footprint 691321300013 (3,81mm - PCB Headers - Vertical - 13p)
pins: 1, 2, 3, 4, 5, 6, 7, 8, 9, 10, 11, 12, 13

## 691321300014
designator J?
WR-TBL Terminal block - serie 3213- 3.81 mm; Manufacturer: Würth Elektronik eiSos GmbH; ComponentLink1 Description: Manufacturer; ComponentLink2 Description: Datasheet; NoPins: 14; Created Date: 11 December 2013; partNo: 691321300014; ComponentLink1URL: http://www.we-online.com; ComponentLink2URL: http://katalog.we-online.de/em/datasheet/6913213000xx.pdf; Created by: Karrer Zheng
footprint 691321300014 (3,81mm - PCB Headers - Vertical - 14p)
pins: 1, 2, 3, 4, 5, 6, 7, 8, 9, 10, 11, 12, 13, 14

## 691321300015
designator J?
WR-TBL Terminal block - serie 3213- 3.81 mm; Manufacturer: Würth Elektronik eiSos GmbH; ComponentLink1 Description: Manufacturer; ComponentLink2 Description: Datasheet; NoPins: 15; Created Date: 11 December 2013; partNo: 691321300015; ComponentLink1URL: http://www.we-online.com; ComponentLink2URL: http://katalog.we-online.de/em/datasheet/6913213000xx.pdf; Created by: Karrer Zheng
footprint 691321300015 (3,81mm - PCB Headers - Vertical - 15p)
pins: 1, 2, 3, 4, 5, 6, 7, 8, 9, 10, 11, 12, 13, 14, 15

## 691321300016
designator J?
WR-TBL Terminal block - serie 3213- 3.81 mm; Manufacturer: Würth Elektronik eiSos GmbH; ComponentLink1 Description: Manufacturer; ComponentLink2 Description: Datasheet; NoPins: 16; Created Date: 11 December 2013; partNo: 691321300016; ComponentLink1URL: http://www.we-online.com; ComponentLink2URL: http://katalog.we-online.de/em/datasheet/6913213000xx.pdf; Created by: Karrer Zheng
footprint 691321300016 (3,81mm - PCB Headers - Vertical - 16p)
pins: 1, 2, 3, 4, 5, 6, 7, 8, 9, 10, 11, 12, 13, 14, 15, 16

## 691321300017
designator J?
WR-TBL Terminal block - serie 3213- 3.81 mm; Manufacturer: Würth Elektronik eiSos GmbH; ComponentLink1 Description: Manufacturer; ComponentLink2 Description: Datasheet; NoPins: 17; Created Date: 11 December 2013; partNo: 691321300017; ComponentLink1URL: http://www.we-online.com; ComponentLink2URL: http://katalog.we-online.de/em/datasheet/6913213000xx.pdf; Created by: Karrer Zheng
footprint 691321300017 (3,81mm - PCB Headers - Vertical - 17p)
pins: 1, 2, 3, 4, 5, 6, 7, 8, 9, 10, 11, 12, 13, 14, 15, 16, 17

## 691321300018
designator J?
WR-TBL Terminal block - serie 3213- 3.81 mm; Manufacturer: Würth Elektronik eiSos GmbH; ComponentLink1 Description: Manufacturer; ComponentLink2 Description: Datasheet; NoPins: 18; Created Date: 11 December 2013; partNo: 691321300018; ComponentLink1URL: http://www.we-online.com; ComponentLink2URL: http://katalog.we-online.de/em/datasheet/6913213000xx.pdf; Created by: Karrer Zheng
footprint 691321300018 (3,81mm - PCB Headers - Vertical - 18p)
pins: 1, 2, 3, 4, 5, 6, 7, 8, 9, 10, 11, 12, 13, 14, 15, 16, 17, 18

## 691321300019
designator J?
WR-TBL Terminal block - serie 3213- 3.81 mm; Manufacturer: Würth Elektronik eiSos GmbH; ComponentLink1 Description: Manufacturer; ComponentLink2 Description: Datasheet; NoPins: 19; Created Date: 11 December 2013; partNo: 691321300019; ComponentLink1URL: http://www.we-online.com; ComponentLink2URL: http://katalog.we-online.de/em/datasheet/6913213000xx.pdf; Created by: Karrer Zheng
footprint 691321300019 (3,81mm - PCB Headers - Vertical - 19p)
pins: 1, 2, 3, 4, 5, 6, 7, 8, 9, 10, 11, 12, 13, 14, 15, 16, 17, 18, 19

## 691321300020
designator J?
WR-TBL Terminal block - serie 3213- 3.81 mm; Manufacturer: Würth Elektronik eiSos GmbH; ComponentLink1 Description: Manufacturer; ComponentLink2 Description: Datasheet; NoPins: 20; Created Date: 11 December 2013; partNo: 691321300020; ComponentLink1URL: http://www.we-online.com; ComponentLink2URL: http://katalog.we-online.de/em/datasheet/6913213000xx.pdf; Created by: Karrer Zheng
footprint 691321300020 (3,81mm - PCB Headers - Vertical - 20p)
pins: 1, 2, 3, 4, 5, 6, 7, 8, 9, 10, 11, 12, 13, 14, 15, 16, 17, 18, 19, 20
